# Altium schematic symbol library MCU_Microchip_ATmega.SchLib: 440 symbols (part 2 of 9) (continued)
## ATmega88PV-10M (continued)

## ATmega88PV-10P
designator *  value ATmega88PV-10P
ki_keywords: AVR 8bit Microcontroller MegaAVR; ki_description: 10MHz, 8kB Flash, 1kB SRAM, 512B EEPROM, DIP-28; ki_fp_filters: DIP*W7.62mm*; Footprint: Package_DIP:DIP-28_W7.62mm; Supplier: http://ww1.microchip.com/downloads/en/DeviceDoc/Atmel-8025-8-bit-AVR-Microcontroller-ATmega48P-88P-168P_Datasheet.pdf
footprint DIP-28_W7.62mm
pins: 1 ~{{RESET}/PC6} (io), 2 PD0 (io), 3 PD1 (io), 4 PD2 (io), 5 PD3 (io), 6 PD4 (io), 7 VCC (power), 8 GND (power), 9 XTAL1/PB6 (io), 10 XTAL2/PB7 (io), 11 PD5 (io), 12 PD6 (io), 13 PD7 (io), 14 PB0 (io), 15 PB1 (io), 16 PB2 (io), 17 PB3 (io), 18 PB4 (io), 19 PB5 (io), 20 AVCC (power), 21 AREF, 22 GND hidden, 23 PC0 (io), 24 PC1 (io), 25 PC2 (io), 26 PC3 (io), 27 PC4 (io), 28 PC5 (io)

## ATmega88V-10A
designator *  value ATmega88V-10A
ki_keywords: AVR 8bit Microcontroller MegaAVR; ki_description: 10MHz, 8kB Flash, 1kB SRAM, 512B EEPROM, TQFP-32; ki_fp_filters: TQFP*7x7mm*P0.8mm*; Footprint: Package_QFP:TQFP-32_7x7mm_P0.8mm; Supplier: http://ww1.microchip.com/downloads/en/DeviceDoc/Atmel-2545-8-bit-AVR-Microcontroller-ATmega48-88-168_Datasheet.pdf
footprint TQFP-32_7x7mm_P0.8mm
pins: 1 PD3 (io), 2 PD4 (io), 3 GND (power), 4 VCC (power), 5 GND hidden, 6 VCC hidden, 7 XTAL1/PB6 (io), 8 XTAL2/PB7 (io), 9 PD5 (io), 10 PD6 (io), 11 PD7 (io), 12 PB0 (io), 13 PB1 (io), 14 PB2 (io), 15 PB3 (io), 16 PB4 (io), 17 PB5 (io), 18 AVCC (power), 19 ADC6 (in), 20 AREF, 21 GND hidden, 22 ADC7 (in), 23 PC0 (io), 24 PC1 (io), 25 PC2 (io), 26 PC3 (io), 27 PC4 (io), 28 PC5 (io), 29 ~{{RESET}/PC6} (io), 30 PD0 (io), 31 PD1 (io), 32 PD2 (io)

## ATmega88V-10M
designator *  value ATmega88V-10M
ki_keywords: AVR 8bit Microcontroller MegaAVR; ki_description: 10MHz, 8kB Flash, 1kB SRAM, 512B EEPROM, QFN-32; ki_fp_filters: QFN*1EP*5x5mm*P0.5mm*; Footprint: Package_DFN_QFN:QFN-32-1EP_5x5mm_P0.5mm_EP3.1x3.1mm; Supplier: http://ww1.microchip.com/downloads/en/DeviceDoc/Atmel-2545-8-bit-AVR-Microcontroller-ATmega48-88-168_Datasheet.pdf
footprint QFN-32-1EP_5x5mm_P0.5mm_EP3.1x3.1mm
pins: 1 PD3 (io), 2 PD4 (io), 3 GND (power), 4 VCC (power), 5 GND hidden, 6 VCC hidden, 7 XTAL1/PB6 (io), 8 XTAL2/PB7 (io), 9 PD5 (io), 10 PD6 (io), 11 PD7 (io), 12 PB0 (io), 13 PB1 (io), 14 PB2 (io), 15 PB3 (io), 16 PB4 (io), 17 PB5 (io), 18 AVCC (power), 19 ADC6 (in), 20 AREF, 21 GND hidden, 22 ADC7 (in), 23 PC0 (io), 24 PC1 (io), 25 PC2 (io), 26 PC3 (io), 27 PC4 (io), 28 PC5 (io), 29 ~{{RESET}/PC6} (io), 30 PD0 (io), 31 PD1 (io), 32 PD2 (io), 33 GND hidden

## ATmega88V-10P
designator *  value ATmega88V-10P
ki_keywords: AVR 8bit Microcontroller MegaAVR; ki_description: 10MHz, 8kB Flash, 1kB SRAM, 512B EEPROM, DIP-28; ki_fp_filters: DIP*W7.62mm*; Footprint: Package_DIP:DIP-28_W7.62mm; Supplier: http://ww1.microchip.com/downloads/en/DeviceDoc/Atmel-2545-8-bit-AVR-Microcontroller-ATmega48-88-168_Datasheet.pdf
footprint DIP-28_W7.62mm
pins: 1 ~{{RESET}/PC6} (io), 2 PD0 (io), 3 PD1 (io), 4 PD2 (io), 5 PD3 (io), 6 PD4 (io), 7 VCC (power), 8 GND (power), 9 XTAL1/PB6 (io), 10 XTAL2/PB7 (io), 11 PD5 (io), 12 PD6 (io), 13 PD7 (io), 14 PB0 (io), 15 PB1 (io), 16 PB2 (io), 17 PB3 (io), 18 PB4 (io), 19 PB5 (io), 20 AVCC (power), 21 AREF, 22 GND hidden, 23 PC0 (io), 24 PC1 (io), 25 PC2 (io), 26 PC3 (io), 27 PC4 (io), 28 PC5 (io)

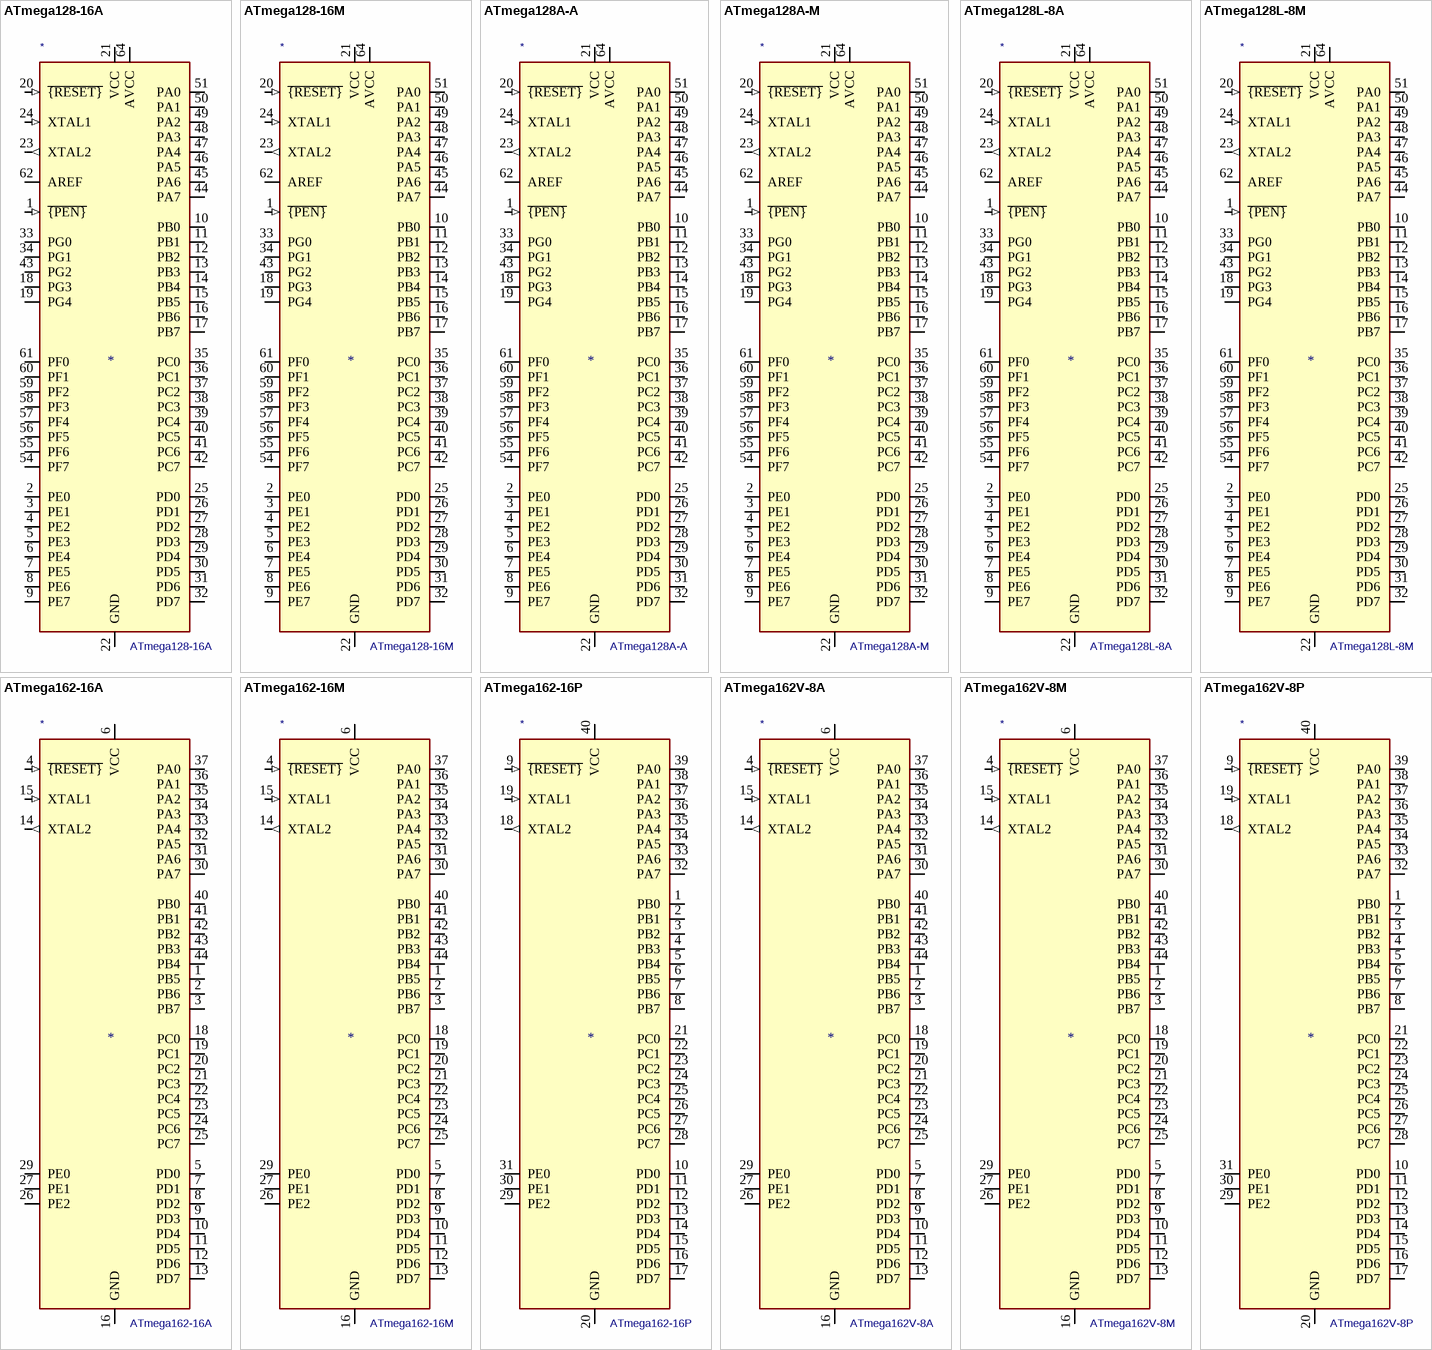
[diagram p8: symbols ATmega128-16A to ATmega162V-8P]

## ATmega128-16A
designator *  value ATmega128-16A
ki_keywords: AVR 8bit Microcontroller MegaAVR; ki_description: 16MHz, 128kB Flash, 4kB SRAM, 4kB EEPROM, JTAG, TQFP-64; ki_fp_filters: TQFP*14x14mm*P0.8mm*; Footprint: Package_QFP:TQFP-64_14x14mm_P0.8mm; Supplier: http://ww1.microchip.com/downloads/en/DeviceDoc/doc2467.pdf
footprint TQFP-64_14x14mm_P0.8mm
pins: 1 ~{{PEN}} (in), 2 PE0 (io), 3 PE1 (io), 4 PE2 (io), 5 PE3 (io), 6 PE4 (io), 7 PE5 (io), 8 PE6 (io), 9 PE7 (io), 10 PB0 (io), 11 PB1 (io), 12 PB2 (io), 13 PB3 (io), 14 PB4 (io), 15 PB5 (io), 16 PB6 (io), 17 PB7 (io), 18 PG3 (io), 19 PG4 (io), 20 ~{{RESET}} (in), 21 VCC (power), 22 GND (power), 23 XTAL2 (out), 24 XTAL1 (in), 25 PD0 (io), 26 PD1 (io), 27 PD2 (io), 28 PD3 (io), 29 PD4 (io), 30 PD5 (io), 31 PD6 (io), 32 PD7 (io), 33 PG0 (io), 34 PG1 (io), 35 PC0 (io), 36 PC1 (io), 37 PC2 (io), 38 PC3 (io), 39 PC4 (io), 40 PC5 (io), 41 PC6 (io), 42 PC7 (io), 43 PG2 (io), 44 PA7 (io), 45 PA6 (io), 46 PA5 (io), 47 PA4 (io), 48 PA3 (io), 49 PA2 (io), 50 PA1 (io), 51 PA0 (io), 52 VCC hidden, 53 GND hidden, 54 PF7 (io), 55 PF6 (io), 56 PF5 (io), 57 PF4 (io), 58 PF3 (io), 59 PF2 (io), 60 PF1 (io), 61 PF0 (io), 62 AREF, 63 GND hidden, 64 AVCC (power)

## ATmega128-16M
designator *  value ATmega128-16M
ki_keywords: AVR 8bit Microcontroller MegaAVR; ki_description: 16MHz, 128kB Flash, 4kB SRAM, 4kB EEPROM, JTAG, QFN-64; ki_fp_filters: QFN*1EP*9x9mm*P0.5mm*; Footprint: Package_DFN_QFN:QFN-64-1EP_9x9mm_P0.5mm_EP5.4x5.4mm; Supplier: http://ww1.microchip.com/downloads/en/DeviceDoc/doc2467.pdf
footprint QFN-64-1EP_9x9mm_P0.5mm_EP5.4x5.4mm
pins: 1 ~{{PEN}} (in), 2 PE0 (io), 3 PE1 (io), 4 PE2 (io), 5 PE3 (io), 6 PE4 (io), 7 PE5 (io), 8 PE6 (io), 9 PE7 (io), 10 PB0 (io), 11 PB1 (io), 12 PB2 (io), 13 PB3 (io), 14 PB4 (io), 15 PB5 (io), 16 PB6 (io), 17 PB7 (io), 18 PG3 (io), 19 PG4 (io), 20 ~{{RESET}} (in), 21 VCC (power), 22 GND (power), 23 XTAL2 (out), 24 XTAL1 (in), 25 PD0 (io), 26 PD1 (io), 27 PD2 (io), 28 PD3 (io), 29 PD4 (io), 30 PD5 (io), 31 PD6 (io), 32 PD7 (io), 33 PG0 (io), 34 PG1 (io), 35 PC0 (io), 36 PC1 (io), 37 PC2 (io), 38 PC3 (io), 39 PC4 (io), 40 PC5 (io), 41 PC6 (io), 42 PC7 (io), 43 PG2 (io), 44 PA7 (io), 45 PA6 (io), 46 PA5 (io), 47 PA4 (io), 48 PA3 (io), 49 PA2 (io), 50 PA1 (io), 51 PA0 (io), 52 VCC hidden, 53 GND hidden, 54 PF7 (io), 55 PF6 (io), 56 PF5 (io), 57 PF4 (io), 58 PF3 (io), 59 PF2 (io), 60 PF1 (io), 61 PF0 (io), 62 AREF, 63 GND hidden, 64 AVCC (power), 65 GND hidden

## ATmega128A-A
designator *  value ATmega128A-A
ki_keywords: AVR 8bit Microcontroller MegaAVR; ki_description: 16MHz, 128kB Flash, 4kB SRAM, 4kB EEPROM, TQFP-64; ki_fp_filters: TQFP*14x14mm*P0.8mm*; Footprint: Package_QFP:TQFP-64_14x14mm_P0.8mm; Supplier: http://ww1.microchip.com/downloads/en/DeviceDoc/Atmel-8151-8-bit-AVR-ATmega128A_Datasheet.pdf
footprint TQFP-64_14x14mm_P0.8mm
pins: 1 ~{{PEN}} (in), 2 PE0 (io), 3 PE1 (io), 4 PE2 (io), 5 PE3 (io), 6 PE4 (io), 7 PE5 (io), 8 PE6 (io), 9 PE7 (io), 10 PB0 (io), 11 PB1 (io), 12 PB2 (io), 13 PB3 (io), 14 PB4 (io), 15 PB5 (io), 16 PB6 (io), 17 PB7 (io), 18 PG3 (io), 19 PG4 (io), 20 ~{{RESET}} (in), 21 VCC (power), 22 GND (power), 23 XTAL2 (out), 24 XTAL1 (in), 25 PD0 (io), 26 PD1 (io), 27 PD2 (io), 28 PD3 (io), 29 PD4 (io), 30 PD5 (io), 31 PD6 (io), 32 PD7 (io), 33 PG0 (io), 34 PG1 (io), 35 PC0 (io), 36 PC1 (io), 37 PC2 (io), 38 PC3 (io), 39 PC4 (io), 40 PC5 (io), 41 PC6 (io), 42 PC7 (io), 43 PG2 (io), 44 PA7 (io), 45 PA6 (io), 46 PA5 (io), 47 PA4 (io), 48 PA3 (io), 49 PA2 (io), 50 PA1 (io), 51 PA0 (io), 52 VCC hidden, 53 GND hidden, 54 PF7 (io), 55 PF6 (io), 56 PF5 (io), 57 PF4 (io), 58 PF3 (io), 59 PF2 (io), 60 PF1 (io), 61 PF0 (io), 62 AREF, 63 GND hidden, 64 AVCC (power)

## ATmega128A-M
designator *  value ATmega128A-M
ki_keywords: AVR 8bit Microcontroller MegaAVR; ki_description: 16MHz, 128kB Flash, 4kB SRAM, 4kB EEPROM, QFN-64; ki_fp_filters: QFN*1EP*9x9mm*P0.5mm*; Footprint: Package_DFN_QFN:QFN-64-1EP_9x9mm_P0.5mm_EP5.4x5.4mm; Supplier: http://ww1.microchip.com/downloads/en/DeviceDoc/Atmel-8151-8-bit-AVR-ATmega128A_Datasheet.pdf
footprint QFN-64-1EP_9x9mm_P0.5mm_EP5.4x5.4mm
pins: 1 ~{{PEN}} (in), 2 PE0 (io), 3 PE1 (io), 4 PE2 (io), 5 PE3 (io), 6 PE4 (io), 7 PE5 (io), 8 PE6 (io), 9 PE7 (io), 10 PB0 (io), 11 PB1 (io), 12 PB2 (io), 13 PB3 (io), 14 PB4 (io), 15 PB5 (io), 16 PB6 (io), 17 PB7 (io), 18 PG3 (io), 19 PG4 (io), 20 ~{{RESET}} (in), 21 VCC (power), 22 GND (power), 23 XTAL2 (out), 24 XTAL1 (in), 25 PD0 (io), 26 PD1 (io), 27 PD2 (io), 28 PD3 (io), 29 PD4 (io), 30 PD5 (io), 31 PD6 (io), 32 PD7 (io), 33 PG0 (io), 34 PG1 (io), 35 PC0 (io), 36 PC1 (io), 37 PC2 (io), 38 PC3 (io), 39 PC4 (io), 40 PC5 (io), 41 PC6 (io), 42 PC7 (io), 43 PG2 (io), 44 PA7 (io), 45 PA6 (io), 46 PA5 (io), 47 PA4 (io), 48 PA3 (io), 49 PA2 (io), 50 PA1 (io), 51 PA0 (io), 52 VCC hidden, 53 GND hidden, 54 PF7 (io), 55 PF6 (io), 56 PF5 (io), 57 PF4 (io), 58 PF3 (io), 59 PF2 (io), 60 PF1 (io), 61 PF0 (io), 62 AREF, 63 GND hidden, 64 AVCC (power), 65 GND hidden

## ATmega128L-8A
designator *  value ATmega128L-8A
ki_keywords: AVR 8bit Microcontroller MegaAVR; ki_description: 8MHz, 128kB Flash, 4kB SRAM, 4kB EEPROM, JTAG, TQFP-64; ki_fp_filters: TQFP*14x14mm*P0.8mm*; Footprint: Package_QFP:TQFP-64_14x14mm_P0.8mm; Supplier: http://ww1.microchip.com/downloads/en/DeviceDoc/doc2467.pdf
footprint TQFP-64_14x14mm_P0.8mm
pins: 1 ~{{PEN}} (in), 2 PE0 (io), 3 PE1 (io), 4 PE2 (io), 5 PE3 (io), 6 PE4 (io), 7 PE5 (io), 8 PE6 (io), 9 PE7 (io), 10 PB0 (io), 11 PB1 (io), 12 PB2 (io), 13 PB3 (io), 14 PB4 (io), 15 PB5 (io), 16 PB6 (io), 17 PB7 (io), 18 PG3 (io), 19 PG4 (io), 20 ~{{RESET}} (in), 21 VCC (power), 22 GND (power), 23 XTAL2 (out), 24 XTAL1 (in), 25 PD0 (io), 26 PD1 (io), 27 PD2 (io), 28 PD3 (io), 29 PD4 (io), 30 PD5 (io), 31 PD6 (io), 32 PD7 (io), 33 PG0 (io), 34 PG1 (io), 35 PC0 (io), 36 PC1 (io), 37 PC2 (io), 38 PC3 (io), 39 PC4 (io), 40 PC5 (io), 41 PC6 (io), 42 PC7 (io), 43 PG2 (io), 44 PA7 (io), 45 PA6 (io), 46 PA5 (io), 47 PA4 (io), 48 PA3 (io), 49 PA2 (io), 50 PA1 (io), 51 PA0 (io), 52 VCC hidden, 53 GND hidden, 54 PF7 (io), 55 PF6 (io), 56 PF5 (io), 57 PF4 (io), 58 PF3 (io), 59 PF2 (io), 60 PF1 (io), 61 PF0 (io), 62 AREF, 63 GND hidden, 64 AVCC (power)

## ATmega128L-8M
designator *  value ATmega128L-8M
ki_keywords: AVR 8bit Microcontroller MegaAVR; ki_description: 8MHz, 128kB Flash, 4kB SRAM, 4kB EEPROM, JTAG, QFN-64; ki_fp_filters: QFN*1EP*9x9mm*P0.5mm*; Footprint: Package_DFN_QFN:QFN-64-1EP_9x9mm_P0.5mm_EP5.4x5.4mm; Supplier: http://ww1.microchip.com/downloads/en/DeviceDoc/doc2467.pdf
footprint QFN-64-1EP_9x9mm_P0.5mm_EP5.4x5.4mm
pins: 1 ~{{PEN}} (in), 2 PE0 (io), 3 PE1 (io), 4 PE2 (io), 5 PE3 (io), 6 PE4 (io), 7 PE5 (io), 8 PE6 (io), 9 PE7 (io), 10 PB0 (io), 11 PB1 (io), 12 PB2 (io), 13 PB3 (io), 14 PB4 (io), 15 PB5 (io), 16 PB6 (io), 17 PB7 (io), 18 PG3 (io), 19 PG4 (io), 20 ~{{RESET}} (in), 21 VCC (power), 22 GND (power), 23 XTAL2 (out), 24 XTAL1 (in), 25 PD0 (io), 26 PD1 (io), 27 PD2 (io), 28 PD3 (io), 29 PD4 (io), 30 PD5 (io), 31 PD6 (io), 32 PD7 (io), 33 PG0 (io), 34 PG1 (io), 35 PC0 (io), 36 PC1 (io), 37 PC2 (io), 38 PC3 (io), 39 PC4 (io), 40 PC5 (io), 41 PC6 (io), 42 PC7 (io), 43 PG2 (io), 44 PA7 (io), 45 PA6 (io), 46 PA5 (io), 47 PA4 (io), 48 PA3 (io), 49 PA2 (io), 50 PA1 (io), 51 PA0 (io), 52 VCC hidden, 53 GND hidden, 54 PF7 (io), 55 PF6 (io), 56 PF5 (io), 57 PF4 (io), 58 PF3 (io), 59 PF2 (io), 60 PF1 (io), 61 PF0 (io), 62 AREF, 63 GND hidden, 64 AVCC (power), 65 GND hidden

## ATmega162-16A
designator *  value ATmega162-16A
ki_keywords: AVR 8bit Microcontroller MegaAVR; ki_description: 16MHz, 16kB Flash, 1kB SRAM, 512B EEPROM, JTAG, TQFP-44; ki_fp_filters: TQFP*10x10mm*P0.8mm*; Footprint: Package_QFP:TQFP-44_10x10mm_P0.8mm; Supplier: http://ww1.microchip.com/downloads/en/DeviceDoc/Atmel-2513-8-bit-AVR-Microntroller-ATmega162_Datasheet.pdf
footprint TQFP-44_10x10mm_P0.8mm
pins: 1 PB5 (io), 2 PB6 (io), 3 PB7 (io), 4 ~{{RESET}} (in), 5 PD0 (io), 6 VCC (power), 7 PD1 (io), 8 PD2 (io), 9 PD3 (io), 10 PD4 (io), 11 PD5 (io), 12 PD6 (io), 13 PD7 (io), 14 XTAL2 (out), 15 XTAL1 (in), 16 GND (power), 17 VCC hidden, 18 PC0 (io), 19 PC1 (io), 20 PC2 (io), 21 PC3 (io), 22 PC4 (io), 23 PC5 (io), 24 PC6 (io), 25 PC7 (io), 26 PE2 (io), 27 PE1 (io), 28 GND hidden, 29 PE0 (io), 30 PA7 (io), 31 PA6 (io), 32 PA5 (io), 33 PA4 (io), 34 PA3 (io), 35 PA2 (io), 36 PA1 (io), 37 PA0 (io), 38 VCC hidden, 39 GND hidden, 40 PB0 (io), 41 PB1 (io), 42 PB2 (io), 43 PB3 (io), 44 PB4 (io)

## ATmega162-16M
designator *  value ATmega162-16M
ki_keywords: AVR 8bit Microcontroller MegaAVR; ki_description: 16MHz, 16kB Flash, 1kB SRAM, 512B EEPROM, JTAG, QFN-44; ki_fp_filters: QFN*1EP*7x7mm*P0.5mm*; Footprint: Package_DFN_QFN:QFN-44-1EP_7x7mm_P0.5mm_EP5.2x5.2mm; Supplier: http://ww1.microchip.com/downloads/en/DeviceDoc/Atmel-2513-8-bit-AVR-Microntroller-ATmega162_Datasheet.pdf
footprint QFN-44-1EP_7x7mm_P0.5mm_EP5.2x5.2mm
pins: 1 PB5 (io), 2 PB6 (io), 3 PB7 (io), 4 ~{{RESET}} (in), 5 PD0 (io), 6 VCC (power), 7 PD1 (io), 8 PD2 (io), 9 PD3 (io), 10 PD4 (io), 11 PD5 (io), 12 PD6 (io), 13 PD7 (io), 14 XTAL2 (out), 15 XTAL1 (in), 16 GND (power), 17 VCC hidden, 18 PC0 (io), 19 PC1 (io), 20 PC2 (io), 21 PC3 (io), 22 PC4 (io), 23 PC5 (io), 24 PC6 (io), 25 PC7 (io), 26 PE2 (io), 27 PE1 (io), 28 GND hidden, 29 PE0 (io), 30 PA7 (io), 31 PA6 (io), 32 PA5 (io), 33 PA4 (io), 34 PA3 (io), 35 PA2 (io), 36 PA1 (io), 37 PA0 (io), 38 VCC hidden, 39 GND hidden, 40 PB0 (io), 41 PB1 (io), 42 PB2 (io), 43 PB3 (io), 44 PB4 (io), 45 GND hidden

## ATmega162-16P
designator *  value ATmega162-16P
ki_keywords: AVR 8bit Microcontroller MegaAVR; ki_description: 16MHz, 16kB Flash, 1kB SRAM, 512B EEPROM, JTAG, DIP-40; ki_fp_filters: DIP*W15.24mm*; Footprint: Package_DIP:DIP-40_W15.24mm; Supplier: http://ww1.microchip.com/downloads/en/DeviceDoc/Atmel-2513-8-bit-AVR-Microntroller-ATmega162_Datasheet.pdf
footprint DIP-40_W15.24mm
pins: 1 PB0 (io), 2 PB1 (io), 3 PB2 (io), 4 PB3 (io), 5 PB4 (io), 6 PB5 (io), 7 PB6 (io), 8 PB7 (io), 9 ~{{RESET}} (in), 10 PD0 (io), 11 PD1 (io), 12 PD2 (io), 13 PD3 (io), 14 PD4 (io), 15 PD5 (io), 16 PD6 (io), 17 PD7 (io), 18 XTAL2 (out), 19 XTAL1 (in), 20 GND (power), 21 PC0 (io), 22 PC1 (io), 23 PC2 (io), 24 PC3 (io), 25 PC4 (io), 26 PC5 (io), 27 PC6 (io), 28 PC7 (io), 29 PE2 (io), 30 PE1 (io), 31 PE0 (io), 32 PA7 (io), 33 PA6 (io), 34 PA5 (io), 35 PA4 (io), 36 PA3 (io), 37 PA2 (io), 38 PA1 (io), 39 PA0 (io), 40 VCC (power)

## ATmega162V-8A
designator *  value ATmega162V-8A
ki_keywords: AVR 8bit Microcontroller MegaAVR; ki_description: 8MHz, 16kB Flash, 1kB SRAM, 512B EEPROM, JTAG, TQFP-44; ki_fp_filters: TQFP*10x10mm*P0.8mm*; Footprint: Package_QFP:TQFP-44_10x10mm_P0.8mm; Supplier: http://ww1.microchip.com/downloads/en/DeviceDoc/Atmel-2513-8-bit-AVR-Microntroller-ATmega162_Datasheet.pdf
footprint TQFP-44_10x10mm_P0.8mm
pins: 1 PB5 (io), 2 PB6 (io), 3 PB7 (io), 4 ~{{RESET}} (in), 5 PD0 (io), 6 VCC (power), 7 PD1 (io), 8 PD2 (io), 9 PD3 (io), 10 PD4 (io), 11 PD5 (io), 12 PD6 (io), 13 PD7 (io), 14 XTAL2 (out), 15 XTAL1 (in), 16 GND (power), 17 VCC hidden, 18 PC0 (io), 19 PC1 (io), 20 PC2 (io), 21 PC3 (io), 22 PC4 (io), 23 PC5 (io), 24 PC6 (io), 25 PC7 (io), 26 PE2 (io), 27 PE1 (io), 28 GND hidden, 29 PE0 (io), 30 PA7 (io), 31 PA6 (io), 32 PA5 (io), 33 PA4 (io), 34 PA3 (io), 35 PA2 (io), 36 PA1 (io), 37 PA0 (io), 38 VCC hidden, 39 GND hidden, 40 PB0 (io), 41 PB1 (io), 42 PB2 (io), 43 PB3 (io), 44 PB4 (io)

## ATmega162V-8M
designator *  value ATmega162V-8M
ki_keywords: AVR 8bit Microcontroller MegaAVR; ki_description: 8MHz, 16kB Flash, 1kB SRAM, 512B EEPROM, JTAG, QFN-44; ki_fp_filters: QFN*1EP*7x7mm*P0.5mm*; Footprint: Package_DFN_QFN:QFN-44-1EP_7x7mm_P0.5mm_EP5.2x5.2mm; Supplier: http://ww1.microchip.com/downloads/en/DeviceDoc/Atmel-2513-8-bit-AVR-Microntroller-ATmega162_Datasheet.pdf
footprint QFN-44-1EP_7x7mm_P0.5mm_EP5.2x5.2mm
pins: 1 PB5 (io), 2 PB6 (io), 3 PB7 (io), 4 ~{{RESET}} (in), 5 PD0 (io), 6 VCC (power), 7 PD1 (io), 8 PD2 (io), 9 PD3 (io), 10 PD4 (io), 11 PD5 (io), 12 PD6 (io), 13 PD7 (io), 14 XTAL2 (out), 15 XTAL1 (in), 16 GND (power), 17 VCC hidden, 18 PC0 (io), 19 PC1 (io), 20 PC2 (io), 21 PC3 (io), 22 PC4 (io), 23 PC5 (io), 24 PC6 (io), 25 PC7 (io), 26 PE2 (io), 27 PE1 (io), 28 GND hidden, 29 PE0 (io), 30 PA7 (io), 31 PA6 (io), 32 PA5 (io), 33 PA4 (io), 34 PA3 (io), 35 PA2 (io), 36 PA1 (io), 37 PA0 (io), 38 VCC hidden, 39 GND hidden, 40 PB0 (io), 41 PB1 (io), 42 PB2 (io), 43 PB3 (io), 44 PB4 (io), 45 GND hidden

## ATmega162V-8P
designator *  value ATmega162V-8P
ki_keywords: AVR 8bit Microcontroller MegaAVR; ki_description: 8MHz, 16kB Flash, 1kB SRAM, 512B EEPROM, JTAG, DIP-40; ki_fp_filters: DIP*W15.24mm*; Footprint: Package_DIP:DIP-40_W15.24mm; Supplier: http://ww1.microchip.com/downloads/en/DeviceDoc/Atmel-2513-8-bit-AVR-Microntroller-ATmega162_Datasheet.pdf
footprint DIP-40_W15.24mm
pins: 1 PB0 (io), 2 PB1 (io), 3 PB2 (io), 4 PB3 (io), 5 PB4 (io), 6 PB5 (io), 7 PB6 (io), 8 PB7 (io), 9 ~{{RESET}} (in), 10 PD0 (io), 11 PD1 (io), 12 PD2 (io), 13 PD3 (io), 14 PD4 (io), 15 PD5 (io), 16 PD6 (io), 17 PD7 (io), 18 XTAL2 (out), 19 XTAL1 (in), 20 GND (power), 21 PC0 (io), 22 PC1 (io), 23 PC2 (io), 24 PC3 (io), 25 PC4 (io), 26 PC5 (io), 27 PC6 (io), 28 PC7 (io), 29 PE2 (io), 30 PE1 (io), 31 PE0 (io), 32 PA7 (io), 33 PA6 (io), 34 PA5 (io), 35 PA4 (io), 36 PA3 (io), 37 PA2 (io), 38 PA1 (io), 39 PA0 (io), 40 VCC (power)

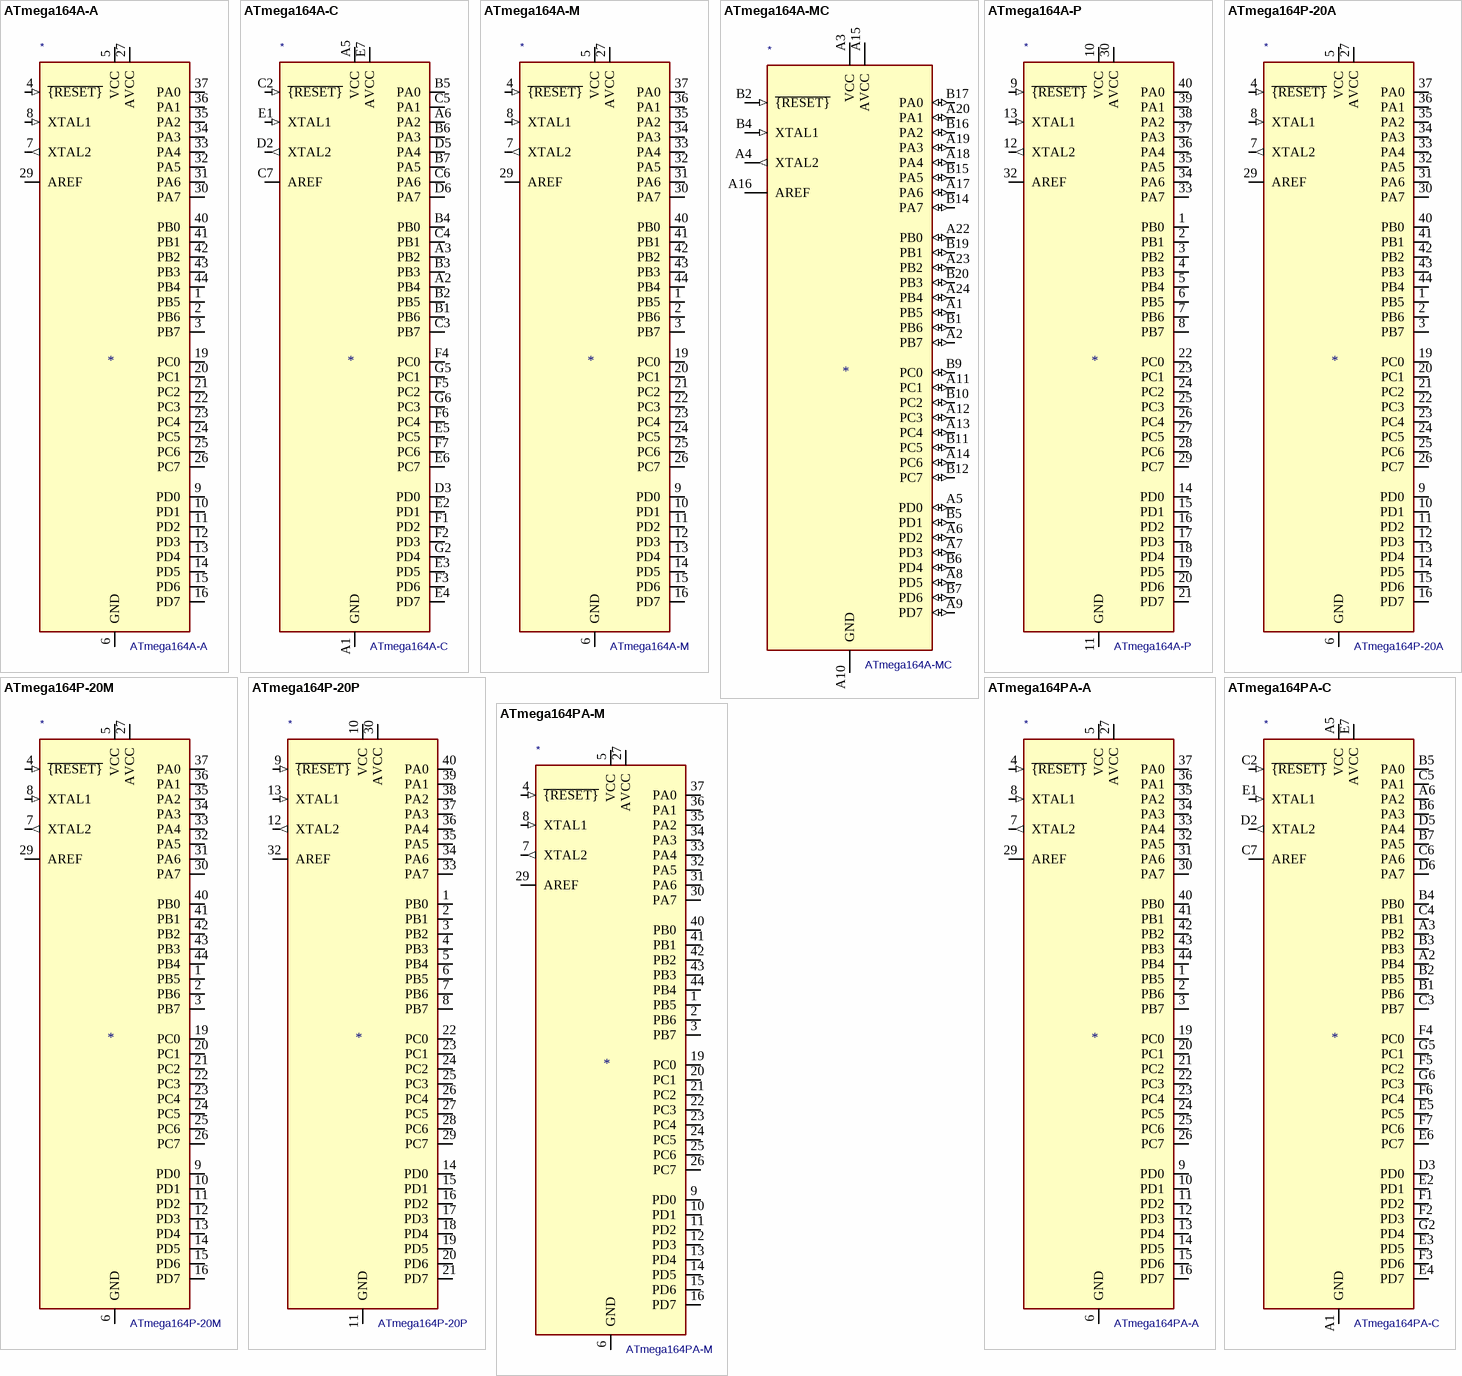
[diagram p9: symbols ATmega164A-A to ATmega164PA-M]

## ATmega164A-A
designator *  value ATmega164A-A
ki_keywords: AVR 8bit Microcontroller MegaAVR; ki_description: 20MHz, 16kB Flash, 1kB SRAM, 512B EEPROM, JTAG, TQFP-44; ki_fp_filters: TQFP*10x10mm*P0.8mm*; Footprint: Package_QFP:TQFP-44_10x10mm_P0.8mm; Supplier: http://ww1.microchip.com/downloads/en/DeviceDoc/Atmel-8272-8-bit-AVR-microcontroller-ATmega164A_PA-324A_PA-644A_PA-1284_P_datasheet.pdf
footprint TQFP-44_10x10mm_P0.8mm
pins: 1 PB5 (io), 2 PB6 (io), 3 PB7 (io), 4 ~{{RESET}} (in), 5 VCC (power), 6 GND (power), 7 XTAL2 (out), 8 XTAL1 (in), 9 PD0 (io), 10 PD1 (io), 11 PD2 (io), 12 PD3 (io), 13 PD4 (io), 14 PD5 (io), 15 PD6 (io), 16 PD7 (io), 17 VCC hidden, 18 GND hidden, 19 PC0 (io), 20 PC1 (io), 21 PC2 (io), 22 PC3 (io), 23 PC4 (io), 24 PC5 (io), 25 PC6 (io), 26 PC7 (io), 27 AVCC (power), 28 GND hidden, 29 AREF, 30 PA7 (io), 31 PA6 (io), 32 PA5 (io), 33 PA4 (io), 34 PA3 (io), 35 PA2 (io), 36 PA1 (io), 37 PA0 (io), 38 VCC hidden, 39 GND hidden, 40 PB0 (io), 41 PB1 (io), 42 PB2 (io), 43 PB3 (io), 44 PB4 (io)

## ATmega164A-C
designator *  value ATmega164A-C
ki_keywords: AVR 8bit Microcontroller MegaAVR; ki_description: 20MHz, 16kB Flash, 1kB SRAM, 512B EEPROM, JTAG, VFBGA-49; ki_fp_filters: VFBGA*5.0x5.0mm*Layout7x7*P0.65mm*; Footprint: Package_BGA:VFBGA-49_5.0x5.0mm_Layout7x7_P0.65mm; Supplier: http://ww1.microchip.com/downloads/en/DeviceDoc/Atmel-8272-8-bit-AVR-microcontroller-ATmega164A_PA-324A_PA-644A_PA-1284_P_datasheet.pdf
footprint VFBGA-49_5.0x5.0mm_Layout7x7_P0.65mm
pins: A1 GND (power), A2 PB4 (io), A3 PB2 (io), A4 GND hidden, A5 VCC (power), A6 PA2 (io), A7 GND hidden, B1 PB6 (io), B2 PB5 (io), B3 PB3 (io), B4 PB0 (io), B5 PA0 (io), B6 PA3 (io), B7 PA5 (io), C1 VCC hidden, C2 ~{{RESET}} (in), C3 PB7 (io), C4 PB1 (io), C5 PA1 (io), C6 PA6 (io), C7 AREF, D1 GND hidden, D2 XTAL2 (out), D3 PD0 (io), D4 GND hidden, D5 PA4 (io), D6 PA7 (io), D7 GND hidden, E1 XTAL1 (in), E2 PD1 (io), E3 PD5 (io), E4 PD7 (io), E5 PC5 (io), E6 PC7 (io), E7 AVCC (power), F1 PD2 (io), F2 PD3 (io), F3 PD6 (io), F4 PC0 (io), F5 PC2 (io), F6 PC4 (io), F7 PC6 (io), G1 GND hidden, G2 PD4 (io), G3 VCC hidden, G4 GND hidden, G5 PC1 (io), G6 PC3 (io), G7 GND hidden

## ATmega164A-M
designator *  value ATmega164A-M
ki_keywords: AVR 8bit Microcontroller MegaAVR; ki_description: 20MHz, 16kB Flash, 1kB SRAM, 512B EEPROM, JTAG, QFN-44; ki_fp_filters: QFN*1EP*7x7mm*P0.5mm*; Footprint: Package_DFN_QFN:QFN-44-1EP_7x7mm_P0.5mm_EP5.2x5.2mm; Supplier: http://ww1.microchip.com/downloads/en/DeviceDoc/Atmel-8272-8-bit-AVR-microcontroller-ATmega164A_PA-324A_PA-644A_PA-1284_P_datasheet.pdf
footprint QFN-44-1EP_7x7mm_P0.5mm_EP5.2x5.2mm
pins: 1 PB5 (io), 2 PB6 (io), 3 PB7 (io), 4 ~{{RESET}} (in), 5 VCC (power), 6 GND (power), 7 XTAL2 (out), 8 XTAL1 (in), 9 PD0 (io), 10 PD1 (io), 11 PD2 (io), 12 PD3 (io), 13 PD4 (io), 14 PD5 (io), 15 PD6 (io), 16 PD7 (io), 17 VCC hidden, 18 GND hidden, 19 PC0 (io), 20 PC1 (io), 21 PC2 (io), 22 PC3 (io), 23 PC4 (io), 24 PC5 (io), 25 PC6 (io), 26 PC7 (io), 27 AVCC (power), 28 GND hidden, 29 AREF, 30 PA7 (io), 31 PA6 (io), 32 PA5 (io), 33 PA4 (io), 34 PA3 (io), 35 PA2 (io), 36 PA1 (io), 37 PA0 (io), 38 VCC hidden, 39 GND hidden, 40 PB0 (io), 41 PB1 (io), 42 PB2 (io), 43 PB3 (io), 44 PB4 (io), 45 GND hidden

## ATmega164A-MC
designator *  value ATmega164A-MC
ki_keywords: AVR 8bit Microcontroller MegaAVR; ki_description: 20MHz, 16kB Flash, 1kB SRAM, 512B EEPROM, JTAG, DRQFN-44; ki_fp_filters: Microchip*DRQFN*1EP*5x5mm*P0.7mm*; Footprint: Package_DFN_QFN:Microchip_DRQFN-44-1EP_5x5mm_P0.7mm_EP2.65x2.65mm; Supplier: http://ww1.microchip.com/downloads/en/DeviceDoc/Atmel-8272-8-bit-AVR-microcontroller-ATmega164A_PA-324A_PA-644A_PA-1284_P_datasheet.pdf
footprint Microchip_DRQFN-44-1EP_5x5mm_P0.7mm_EP2.65x2.65mm
pins: A1 PB5 (io), A2 PB7 (io), A3 VCC (power), A4 XTAL2 (out), A5 PD0 (io), A6 PD2 (io), A7 PD3 (io), A8 PD5 (io), A9 PD7 (io), A10 GND (power), A11 PC1 (io), A12 PC3 (io), A13 PC4 (io), A14 PC6 (io), A15 AVCC (power), A16 AREF, A17 PA6 (io), A18 PA4 (io), A19 PA3 (io), A20 PA1 (io), A21 VCC hidden, A22 PB0 (io), A23 PB2 (io), A24 PB4 (io), B1 PB6 (io), B2 ~{{RESET}} (in), B3 GND hidden, B4 XTAL1 (in), B5 PD1 (io), B6 PD4 (io), B7 PD6 (io), B8 VCC hidden, B9 PC0 (io), B10 PC2 (io), B11 PC5 (io), B12 PC7 (io), B13 GND hidden, B14 PA7 (io), B15 PA5 (io), B16 PA2 (io), B17 PA0 (io), B18 GND hidden, B19 PB1 (io), B20 PB3 (io), EP GND hidden

## ATmega164A-P
designator *  value ATmega164A-P
ki_keywords: AVR 8bit Microcontroller MegaAVR; ki_description: 20MHz, 16kB Flash, 1kB SRAM, 512B EEPROM, JTAG, DIP-40; ki_fp_filters: DIP*W15.24mm*; Footprint: Package_DIP:DIP-40_W15.24mm; Supplier: http://ww1.microchip.com/downloads/en/DeviceDoc/Atmel-8272-8-bit-AVR-microcontroller-ATmega164A_PA-324A_PA-644A_PA-1284_P_datasheet.pdf
footprint DIP-40_W15.24mm
pins: 1 PB0 (io), 2 PB1 (io), 3 PB2 (io), 4 PB3 (io), 5 PB4 (io), 6 PB5 (io), 7 PB6 (io), 8 PB7 (io), 9 ~{{RESET}} (in), 10 VCC (power), 11 GND (power), 12 XTAL2 (out), 13 XTAL1 (in), 14 PD0 (io), 15 PD1 (io), 16 PD2 (io), 17 PD3 (io), 18 PD4 (io), 19 PD5 (io), 20 PD6 (io), 21 PD7 (io), 22 PC0 (io), 23 PC1 (io), 24 PC2 (io), 25 PC3 (io), 26 PC4 (io), 27 PC5 (io), 28 PC6 (io), 29 PC7 (io), 30 AVCC (power), 31 GND hidden, 32 AREF, 33 PA7 (io), 34 PA6 (io), 35 PA5 (io), 36 PA4 (io), 37 PA3 (io), 38 PA2 (io), 39 PA1 (io), 40 PA0 (io)

## ATmega164P-20A
designator *  value ATmega164P-20A
ki_keywords: AVR 8bit Microcontroller MegaAVR PicoPower; ki_description: 20MHz, 16kB Flash, 1kB SRAM, 512B EEPROM, JTAG, TQFP-44; ki_fp_filters: TQFP*10x10mm*P0.8mm*; Footprint: Package_QFP:TQFP-44_10x10mm_P0.8mm; Supplier: http://ww1.microchip.com/downloads/en/DeviceDoc/Atmel-42742-ATmega164P_Datasheet.pdf
footprint TQFP-44_10x10mm_P0.8mm
pins: 1 PB5 (io), 2 PB6 (io), 3 PB7 (io), 4 ~{{RESET}} (in), 5 VCC (power), 6 GND (power), 7 XTAL2 (out), 8 XTAL1 (in), 9 PD0 (io), 10 PD1 (io), 11 PD2 (io), 12 PD3 (io), 13 PD4 (io), 14 PD5 (io), 15 PD6 (io), 16 PD7 (io), 17 VCC hidden, 18 GND hidden, 19 PC0 (io), 20 PC1 (io), 21 PC2 (io), 22 PC3 (io), 23 PC4 (io), 24 PC5 (io), 25 PC6 (io), 26 PC7 (io), 27 AVCC (power), 28 GND hidden, 29 AREF, 30 PA7 (io), 31 PA6 (io), 32 PA5 (io), 33 PA4 (io), 34 PA3 (io), 35 PA2 (io), 36 PA1 (io), 37 PA0 (io), 38 VCC hidden, 39 GND hidden, 40 PB0 (io), 41 PB1 (io), 42 PB2 (io), 43 PB3 (io), 44 PB4 (io)

## ATmega164P-20M
designator *  value ATmega164P-20M
ki_keywords: AVR 8bit Microcontroller MegaAVR PicoPower; ki_description: 20MHz, 16kB Flash, 1kB SRAM, 512B EEPROM, JTAG, QFN-44; ki_fp_filters: QFN*1EP*7x7mm*P0.5mm*; Footprint: Package_DFN_QFN:QFN-44-1EP_7x7mm_P0.5mm_EP5.2x5.2mm; Supplier: http://ww1.microchip.com/downloads/en/DeviceDoc/Atmel-42742-ATmega164P_Datasheet.pdf
footprint QFN-44-1EP_7x7mm_P0.5mm_EP5.2x5.2mm
pins: 1 PB5 (io), 2 PB6 (io), 3 PB7 (io), 4 ~{{RESET}} (in), 5 VCC (power), 6 GND (power), 7 XTAL2 (out), 8 XTAL1 (in), 9 PD0 (io), 10 PD1 (io), 11 PD2 (io), 12 PD3 (io), 13 PD4 (io), 14 PD5 (io), 15 PD6 (io), 16 PD7 (io), 17 VCC hidden, 18 GND hidden, 19 PC0 (io), 20 PC1 (io), 21 PC2 (io), 22 PC3 (io), 23 PC4 (io), 24 PC5 (io), 25 PC6 (io), 26 PC7 (io), 27 AVCC (power), 28 GND hidden, 29 AREF, 30 PA7 (io), 31 PA6 (io), 32 PA5 (io), 33 PA4 (io), 34 PA3 (io), 35 PA2 (io), 36 PA1 (io), 37 PA0 (io), 38 VCC hidden, 39 GND hidden, 40 PB0 (io), 41 PB1 (io), 42 PB2 (io), 43 PB3 (io), 44 PB4 (io), 45 GND hidden

## ATmega164P-20P
designator *  value ATmega164P-20P
ki_keywords: AVR 8bit Microcontroller MegaAVR PicoPower; ki_description: 20MHz, 16kB Flash, 1kB SRAM, 512B EEPROM, JTAG, DIP-40; ki_fp_filters: DIP*W15.24mm*; Footprint: Package_DIP:DIP-40_W15.24mm; Supplier: http://ww1.microchip.com/downloads/en/DeviceDoc/Atmel-42742-ATmega164P_Datasheet.pdf
footprint DIP-40_W15.24mm
pins: 1 PB0 (io), 2 PB1 (io), 3 PB2 (io), 4 PB3 (io), 5 PB4 (io), 6 PB5 (io), 7 PB6 (io), 8 PB7 (io), 9 ~{{RESET}} (in), 10 VCC (power), 11 GND (power), 12 XTAL2 (out), 13 XTAL1 (in), 14 PD0 (io), 15 PD1 (io), 16 PD2 (io), 17 PD3 (io), 18 PD4 (io), 19 PD5 (io), 20 PD6 (io), 21 PD7 (io), 22 PC0 (io), 23 PC1 (io), 24 PC2 (io), 25 PC3 (io), 26 PC4 (io), 27 PC5 (io), 28 PC6 (io), 29 PC7 (io), 30 AVCC (power), 31 GND hidden, 32 AREF, 33 PA7 (io), 34 PA6 (io), 35 PA5 (io), 36 PA4 (io), 37 PA3 (io), 38 PA2 (io), 39 PA1 (io), 40 PA0 (io)

## ATmega164PA-A
designator *  value ATmega164PA-A
ki_keywords: AVR 8bit Microcontroller MegaAVR PicoPower; ki_description: 20MHz, 16kB Flash, 1kB SRAM, 512B EEPROM, JTAG, TQFP-44; ki_fp_filters: TQFP*10x10mm*P0.8mm*; Footprint: Package_QFP:TQFP-44_10x10mm_P0.8mm; Supplier: http://ww1.microchip.com/downloads/en/DeviceDoc/Atmel-8272-8-bit-AVR-microcontroller-ATmega164A_PA-324A_PA-644A_PA-1284_P_datasheet.pdf
footprint TQFP-44_10x10mm_P0.8mm
pins: 1 PB5 (io), 2 PB6 (io), 3 PB7 (io), 4 ~{{RESET}} (in), 5 VCC (power), 6 GND (power), 7 XTAL2 (out), 8 XTAL1 (in), 9 PD0 (io), 10 PD1 (io), 11 PD2 (io), 12 PD3 (io), 13 PD4 (io), 14 PD5 (io), 15 PD6 (io), 16 PD7 (io), 17 VCC hidden, 18 GND hidden, 19 PC0 (io), 20 PC1 (io), 21 PC2 (io), 22 PC3 (io), 23 PC4 (io), 24 PC5 (io), 25 PC6 (io), 26 PC7 (io), 27 AVCC (power), 28 GND hidden, 29 AREF, 30 PA7 (io), 31 PA6 (io), 32 PA5 (io), 33 PA4 (io), 34 PA3 (io), 35 PA2 (io), 36 PA1 (io), 37 PA0 (io), 38 VCC hidden, 39 GND hidden, 40 PB0 (io), 41 PB1 (io), 42 PB2 (io), 43 PB3 (io), 44 PB4 (io)

## ATmega164PA-C
designator *  value ATmega164PA-C
ki_keywords: AVR 8bit Microcontroller MegaAVR PicoPower; ki_description: 20MHz, 16kB Flash, 1kB SRAM, 512B EEPROM, JTAG, VFBGA-49; ki_fp_filters: VFBGA*5.0x5.0mm*Layout7x7*P0.65mm*; Footprint: Package_BGA:VFBGA-49_5.0x5.0mm_Layout7x7_P0.65mm; Supplier: http://ww1.microchip.com/downloads/en/DeviceDoc/Atmel-8272-8-bit-AVR-microcontroller-ATmega164A_PA-324A_PA-644A_PA-1284_P_datasheet.pdf
footprint VFBGA-49_5.0x5.0mm_Layout7x7_P0.65mm
pins: A1 GND (power), A2 PB4 (io), A3 PB2 (io), A4 GND hidden, A5 VCC (power), A6 PA2 (io), A7 GND hidden, B1 PB6 (io), B2 PB5 (io), B3 PB3 (io), B4 PB0 (io), B5 PA0 (io), B6 PA3 (io), B7 PA5 (io), C1 VCC hidden, C2 ~{{RESET}} (in), C3 PB7 (io), C4 PB1 (io), C5 PA1 (io), C6 PA6 (io), C7 AREF, D1 GND hidden, D2 XTAL2 (out), D3 PD0 (io), D4 GND hidden, D5 PA4 (io), D6 PA7 (io), D7 GND hidden, E1 XTAL1 (in), E2 PD1 (io), E3 PD5 (io), E4 PD7 (io), E5 PC5 (io), E6 PC7 (io), E7 AVCC (power), F1 PD2 (io), F2 PD3 (io), F3 PD6 (io), F4 PC0 (io), F5 PC2 (io), F6 PC4 (io), F7 PC6 (io), G1 GND hidden, G2 PD4 (io), G3 VCC hidden, G4 GND hidden, G5 PC1 (io), G6 PC3 (io), G7 GND hidden

## ATmega164PA-M
designator *  value ATmega164PA-M
ki_keywords: AVR 8bit Microcontroller MegaAVR PicoPower; ki_description: 20MHz, 16kB Flash, 1kB SRAM, 512B EEPROM, JTAG, QFN-44; ki_fp_filters: QFN*1EP*7x7mm*P0.5mm*; Footprint: Package_DFN_QFN:QFN-44-1EP_7x7mm_P0.5mm_EP5.2x5.2mm; Supplier: http://ww1.microchip.com/downloads/en/DeviceDoc/Atmel-8272-8-bit-AVR-microcontroller-ATmega164A_PA-324A_PA-644A_PA-1284_P_datasheet.pdf
footprint QFN-44-1EP_7x7mm_P0.5mm_EP5.2x5.2mm
pins: 1 PB5 (io), 2 PB6 (io), 3 PB7 (io), 4 ~{{RESET}} (in), 5 VCC (power), 6 GND (power), 7 XTAL2 (out), 8 XTAL1 (in), 9 PD0 (io), 10 PD1 (io), 11 PD2 (io), 12 PD3 (io), 13 PD4 (io), 14 PD5 (io), 15 PD6 (io), 16 PD7 (io), 17 VCC hidden, 18 GND hidden, 19 PC0 (io), 20 PC1 (io), 21 PC2 (io), 22 PC3 (io), 23 PC4 (io), 24 PC5 (io), 25 PC6 (io), 26 PC7 (io), 27 AVCC (power), 28 GND hidden, 29 AREF, 30 PA7 (io), 31 PA6 (io), 32 PA5 (io), 33 PA4 (io), 34 PA3 (io), 35 PA2 (io), 36 PA1 (io), 37 PA0 (io), 38 VCC hidden, 39 GND hidden, 40 PB0 (io), 41 PB1 (io), 42 PB2 (io), 43 PB3 (io), 44 PB4 (io), 45 GND hidden

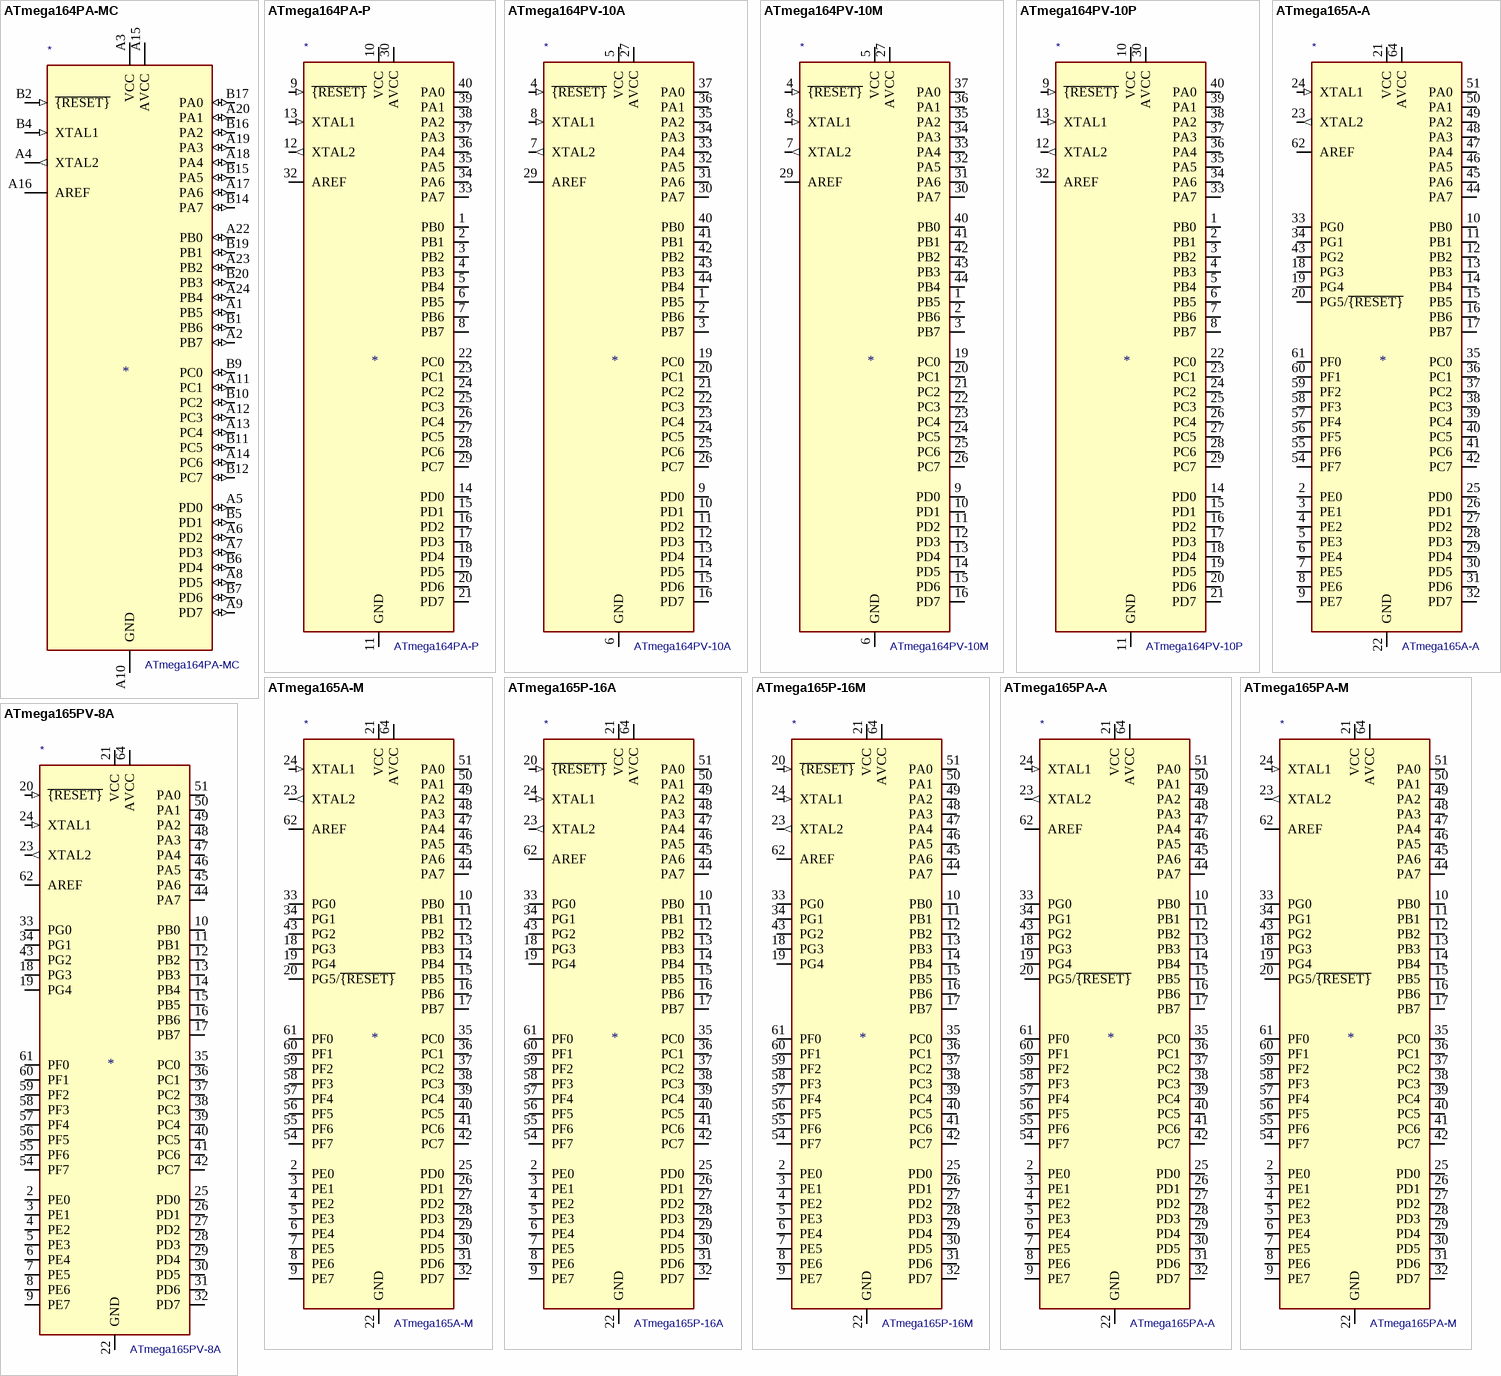
[diagram p10: symbols ATmega164PA-MC to ATmega165PV-8A]